# Altium footprint library texas.PCBLIB: 168 footprints (part 14 of 14)
Each footprint in its own frame and in the unit in brackets; x right, y up, seen from the top. Pads: shape width x height; smd on the part's side, far side on the other; paste and mask are expansions set on the pad; w line width, h text height; cw(c..) or ccw(c..) is an arc to the next point about the centre after c.
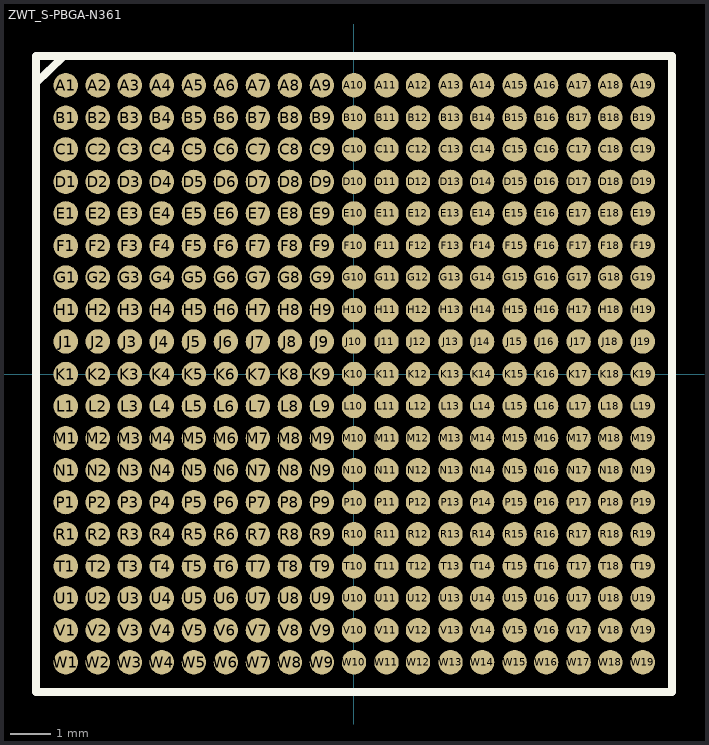
[diagram p13: the footprint, top view; thin cyan lines are the x and y axes]

## ZWT_S-PBGA-N361 [mil]
pads (361):
  rrect100% 24x24 smd: A1(-283.46,284) A2(-251.97,284) A3(-220.47,284) A4(-188.98,284) A5(-157.48,284) A6(-125.98,284) A7(-94.49,284) A8(-62.99,284) A9(-31.5,284) A10(0,284) A11(32,284) A12(63,284) A13(95,284) A14(126,284) A15(158,284) A16(189,284) A17(221,284) A18(252,284) A19(284,284) B1(-283.46,252) B2(-251.97,252) B3(-220.47,252) B4(-188.98,252) B5(-157.48,252) B6(-125.98,252) B7(-94.49,252) B8(-62.99,252) B9(-31.5,252) B10(0,252) B11(32,252) B12(63,252) B13(95,252) B14(126,252) B15(158,252) B16(189,252) B17(221,252) B18(252,252) B19(284,252) C1(-283.46,221) C2(-251.97,221) C3(-220.47,221) C4(-188.98,221) C5(-157.48,221) C6(-125.98,221) C7(-94.49,221) C8(-62.99,221) C9(-31.5,221) C10(0,221) C11(32,221) C12(63,221) C13(95,221) C14(126,221) C15(158,221) C16(189,221) C17(221,221) C18(252,221) C19(284,221) D1(-283.46,189) D2(-251.97,189) D3(-220.47,189) D4(-188.98,189) D5(-157.48,189) D6(-125.98,189) D7(-94.49,189) D8(-62.99,189) D9(-31.5,189) D10(0,189) D11(32,189) D12(63,189) D13(95,189) D14(126,189) D15(158,189) D16(189,189) D17(221,189) D18(252,189) D19(284,189) E1(-283.46,158) E2(-251.97,158) E3(-220.47,158) E4(-188.98,158) E5(-157.48,158) E6(-125.98,158) E7(-94.49,158) E8(-62.99,158) E9(-31.5,158) E10(0,158) E11(32,158) E12(63,158) E13(95,158) E14(126,158) E15(158,158) E16(189,158) E17(221,158) E18(252,158) E19(284,158) F1(-283.46,126) F2(-251.97,126) F3(-220.47,126) F4(-188.98,126) F5(-157.48,126) F6(-125.98,126) F7(-94.49,126) F8(-62.99,126) F9(-31.5,126) F10(0,126) F11(32,126) F12(63,126) F13(95,126) F14(126,126) F15(158,126) F16(189,126) F17(221,126) F18(252,126) F19(284,126) G1(-283.46,95) G2(-251.97,95) G3(-220.47,95) G4(-188.98,95) G5(-157.48,95) G6(-125.98,95) G7(-94.49,95) G8(-62.99,95) G9(-31.5,95) G10(0,95) G11(32,95) G12(63,95) G13(95,95) G14(126,95) G15(158,95) G16(189,95) G17(221,95) G18(252,95) G19(284,95) H1(-283.46,63) H2(-251.97,63) H3(-220.47,63) H4(-188.98,63) H5(-157.48,63) H6(-125.98,63) H7(-94.49,63) H8(-62.99,63) H9(-31.5,63) H10(0,63) H11(32,63) H12(63,63) H13(95,63) H14(126,63) H15(158,63) H16(189,63) H17(221,63) H18(252,63) H19(284,63) J1(-283.46,32) J2(-251.97,32) J3(-220.47,32) J4(-188.98,32) J5(-157.48,32) J6(-125.98,32) J7(-94.49,32) J8(-62.99,32) J9(-31.5,32) J10(0,32) J11(32,32) J12(63,32) J13(95,32) J14(126,32) J15(158,32) J16(189,32) J17(221,32) J18(252,32) J19(284,32) K1(-283.46,0) K2(-251.97,0) K3(-220.47,0) K4(-188.98,0) K5(-157.48,0) K6(-125.98,0) K7(-94.49,0) K8(-62.99,0) K9(-31.5,0) K10(0,0) K11(32,0) K12(63,0) K13(95,0) K14(126,0) K15(158,0) K16(189,0) K17(221,0) K18(252,0) K19(284,0) L1(-283.46,-31.5) L2(-251.97,-31.5) L3(-220.47,-31.5) L4(-188.98,-31.5) L5(-157.48,-31.5) L6(-125.98,-31.5) L7(-94.49,-31.5) L8(-62.99,-31.5) L9(-31.5,-31.5) L10(0,-31.5) L11(32,-31.5) L12(63,-31.5) L13(95,-31.5) L14(126,-31.5) L15(158,-31.5) L16(189,-31.5) L17(221,-31.5) L18(252,-31.5) L19(284,-31.5) M1(-283.46,-62.99) M2(-251.97,-62.99) M3(-220.47,-62.99) M4(-188.98,-62.99) M5(-157.48,-62.99) M6(-125.98,-62.99) M7(-94.49,-62.99) M8(-62.99,-62.99) M9(-31.5,-62.99) M10(0,-62.99) M11(32,-62.99) M12(63,-62.99) M13(95,-62.99) M14(126,-62.99) M15(158,-62.99) M16(189,-62.99) M17(221,-62.99) M18(252,-62.99) M19(284,-62.99) N1(-283.46,-94.49) N2(-251.97,-94.49) N3(-220.47,-94.49) N4(-188.98,-94.49) N5(-157.48,-94.49) N6(-125.98,-94.49) N7(-94.49,-94.49) N8(-62.99,-94.49) N9(-31.5,-94.49) N10(0,-94.49) N11(32,-94.49) N12(63,-94.49) N13(95,-94.49) N14(126,-94.49) N15(158,-94.49) N16(189,-94.49) N17(221,-94.49) N18(252,-94.49) N19(284,-94.49) P1(-283.46,-125.98) P2(-251.97,-125.98) P3(-220.47,-125.98) P4(-188.98,-125.98) P5(-157.48,-125.98) P6(-125.98,-125.98) P7(-94.49,-125.98) P8(-62.99,-125.98) P9(-31.5,-125.98) P10(0,-125.98) P11(32,-125.98) P12(63,-125.98) P13(95,-125.98) P14(126,-125.98) P15(158,-125.98) P16(189,-125.98) P17(221,-125.98) P18(252,-125.98) P19(284,-125.98) R1(-283.46,-157.48) R2(-251.97,-157.48) R3(-220.47,-157.48) R4(-188.98,-157.48) R5(-157.48,-157.48) R6(-125.98,-157.48) R7(-94.49,-157.48) R8(-62.99,-157.48) R9(-31.5,-157.48) R10(0,-157.48) R11(32,-157.48) R12(63,-157.48) R13(95,-157.48) R14(126,-157.48) R15(158,-157.48) R16(189,-157.48) R17(221,-157.48) R18(252,-157.48) R19(284,-157.48) T1(-283.46,-188.98) T2(-251.97,-188.98) T3(-220.47,-188.98) T4(-188.98,-188.98) T5(-157.48,-188.98) T6(-125.98,-188.98) T7(-94.49,-188.98) T8(-62.99,-188.98) T9(-31.5,-188.98) T10(0,-188.98) T11(32,-188.98) T12(63,-188.98) T13(95,-188.98) T14(126,-188.98) T15(158,-188.98) T16(189,-188.98) T17(221,-188.98) T18(252,-188.98) T19(284,-188.98) U1(-283.46,-220.47) U2(-251.97,-220.47) U3(-220.47,-220.47) U4(-188.98,-220.47) U5(-157.48,-220.47) U6(-125.98,-220.47) U7(-94.49,-220.47) U8(-62.99,-220.47) U9(-31.5,-220.47) U10(0,-220.47) U11(32,-220.47) U12(63,-220.47) U13(95,-220.47) U14(126,-220.47) U15(158,-220.47) U16(189,-220.47) U17(221,-220.47) U18(252,-220.47) U19(284,-220.47) V1(-283.46,-251.97) V2(-251.97,-251.97) V3(-220.47,-251.97) V4(-188.98,-251.97) V5(-157.48,-251.97) V6(-125.98,-251.97) V7(-94.49,-251.97) V8(-62.99,-251.97) V9(-31.5,-251.97) V10(0,-251.97) V11(32,-251.97) V12(63,-251.97) V13(95,-251.97) V14(126,-251.97) V15(158,-251.97) V16(189,-251.97) V17(221,-251.97) V18(252,-251.97) V19(284,-251.97) W1(-283.46,-283.46) W2(-251.97,-283.46) W3(-220.47,-283.46) W4(-188.98,-283.46) W5(-157.48,-283.46) W6(-125.98,-283.46) W7(-94.49,-283.46) W8(-62.99,-283.46) W9(-31.5,-283.46) W10(0,-283.46) W11(32,-283.46) W12(63,-283.46) W13(95,-283.46) W14(126,-283.46) W15(158,-283.46) W16(189,-283.46) W17(221,-283.46) W18(252,-283.46) W19(284,-283.46)
Top Overlay:
  lines w8: -312.93,286 -312.93,313 -285.43,313 ; -312.93,286 -312.93,-312.93 313,-312.93 313,313 -285.43,313 ; -312.93,286 -285.43,313
Top Solder:
  drawing of 361 lines, arcs and shapes, not listed